# Altium integrated library Plytka_rozwojowa_ZCAD.IntLib: 103 symbols (part 1 of 2)
Pins are listed as number, name and electrical type; pins without a type are passive.

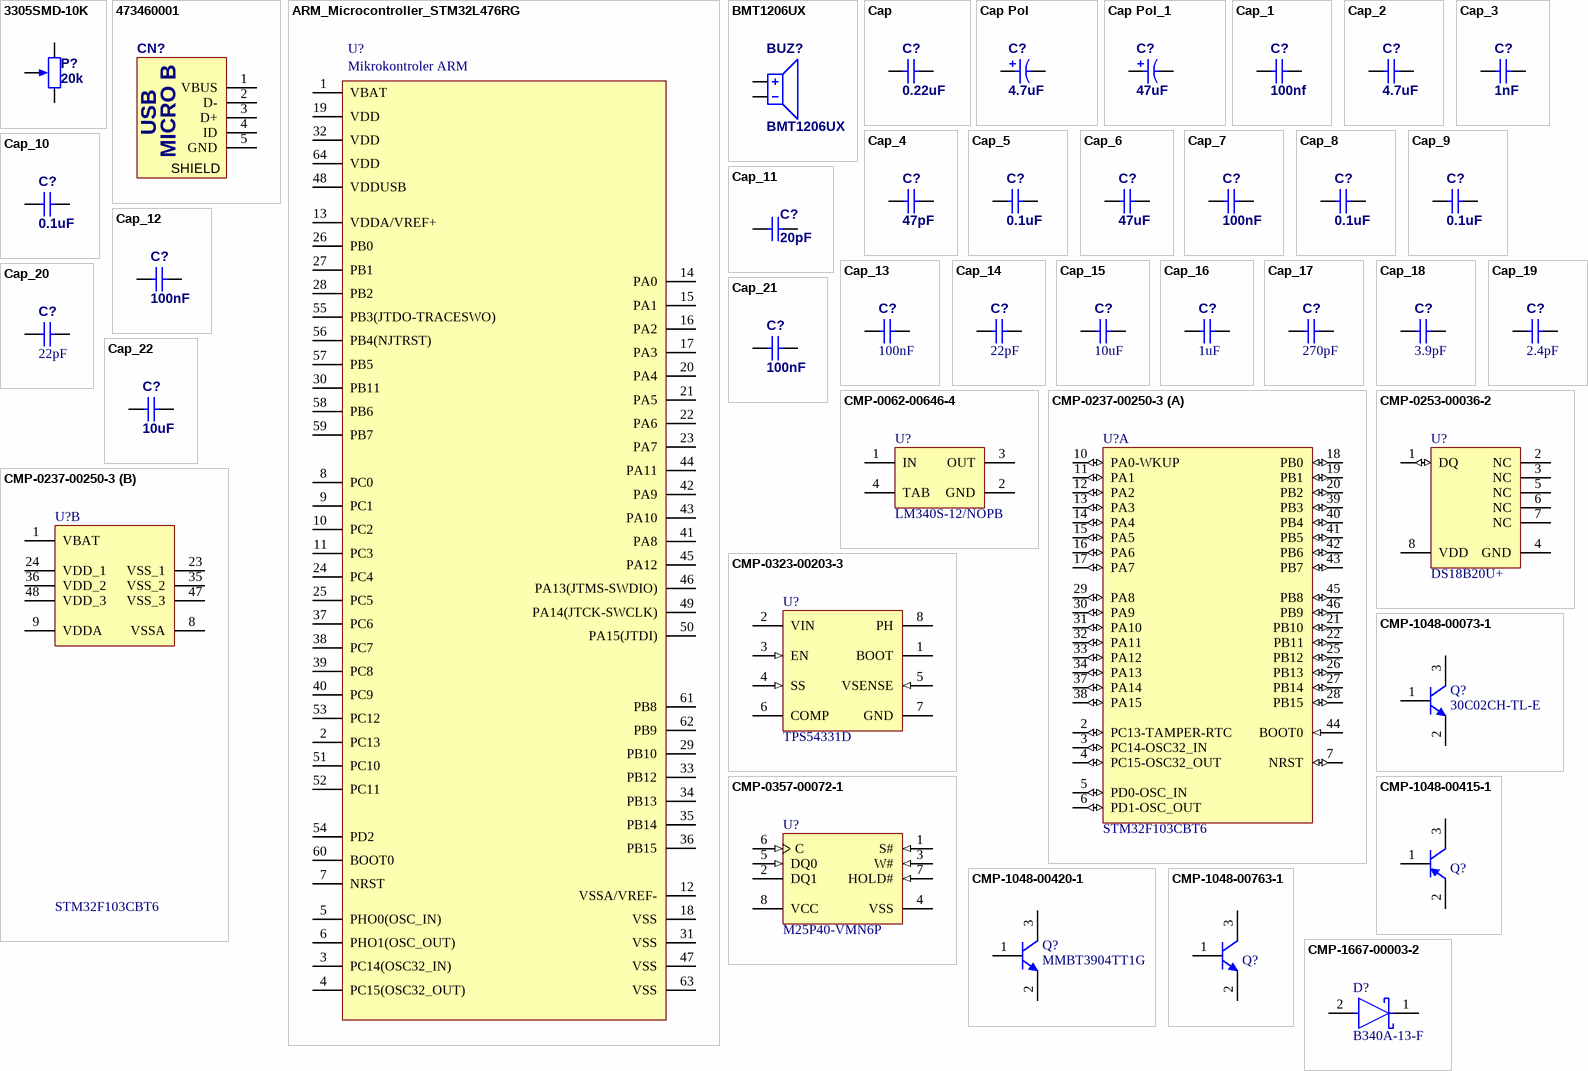
[diagram p0: symbols 3305SMD-10K to CMP-1667-00003-2]

## 3305SMD-10K
designator P?, comment 20k
3305SMD-10K; Published: 21-10-2009; ComponentLink1Description: datasheet; ComponentLink2Description: supplier; Value: 20k
footprint 3305SMD (SRPassives 3305 SMT trimming potentiometer)
pins: 1 TOP, 2 BOT, 3 TAP
1 alternate drawing of the same symbol

## 473460001
designator CN?  (value not drawn)
Molex 473460001 microUSB Connector; Published: 20-Mar-2006; Supplier 1: Farnell; Supplier 2: TME; Supplier Part Number 1: 2426321; Supplier Part Number 2: MX-47346-0001; Shop link: TME: @MX-105017-0001
footprint 473460001 (Molex 473460001 microUSB Connector)
pins: 1 VBUS "+5 VDC", 2 D- "Data -", 3 D+ "Data +", 4 ID "Ground", 5 GND "Ground", S SHIELD hidden "Shield"
text: USB; MICRO B

## ARM_Microcontroller_STM32L476RG
designator U?, comment Mikrokontroler ARM
Model: STM32L476RGT6; Shop link: https://pl.mouser.com/ProductDetail/STMicroelectronics/STM32L476RGT6?qs=o58qnh%2FCpu44V%252B7CaDZzCA%3D%3D; Quantity: *; Voltage: *; Assembly type: SMD; Footprint link: https://www.snapeda.com/parts/STM32L476RGT6/STMicroelectronics/view-part/?ref=search&t=STM32L476RGT6; Value: *; 3D model link: https://www.st.com/en/microcontrollers-microprocessors/stm32l476rg.html#cad-resources
footprint QFP50P1200X1200X160-64N
pins: 1 VBAT, 2 PC13, 3 PC14(OSC32_IN), 4 PC15(OSC32_OUT), 5 PHO0(OSC_IN), 6 PHO1(OSC_OUT), 7 NRST, 8 PC0, 9 PC1, 10 PC2, 11 PC3, 12 VSSA/VREF-, 13 VDDA/VREF+, 14 PA0, 15 PA1, 16 PA2, 17 PA3, 18 VSS, 19 VDD, 20 PA4, 21 PA5, 22 PA6, 23 PA7, 24 PC4, 25 PC5, 26 PB0, 27 PB1, 28 PB2, 29 PB10, 30 PB11, 31 VSS, 32 VDD, 33 PB12, 34 PB13, 35 PB14, 36 PB15, 37 PC6, 38 PC7, 39 PC8, 40 PC9, 41 PA8, 42 PA9, 43 PA10, 44 PA11, 45 PA12, 46 PA13(JTMS-SWDIO), 47 VSS, 48 VDDUSB, 49 PA14(JTCK-SWCLK), 50 PA15(JTDI), 51 PC10, 52 PC11, 53 PC12, 54 PD2, 55 PB3(JTDO-TRACESWO), 56 PB4(NJTRST), 57 PB5, 58 PB6, 59 PB7, 60 BOOT0, 61 PB8, 62 PB9, 63 VSS, 64 VDD

## BMT1206UX
designator BUZ?
Buzzer
footprint BUZ-12-7,6 (BUZZER (w generator), D:12mm, P:7,6mm (eg. BMT1203UX))
footprint BUZ-12-7,6-COVER (BUZZER (w generator), D:12mm, P:7,6mm (eg. BMT1203UX))
footprint Buzzer - LD-BZEG-1305 (https://www.tme.eu/pl/details/bmt-0912xh05/sygnalizatory-elektromag-z-generatorem/bestar/bmt0912xh05/)
pins: 1, 2

## Cap
designator C?  value 0.22uF
Ceramic capacitor MLCC SMD ±5%; ComponentLink1Description: datasheet; ComponentLink2Description: supplier
footprint C0805
footprint C1206
footprint CC2,5
footprint CC5
footprint CC7,5
footprint CC5-10-15
footprint C0603
footprint C0402
footprint CF5X10,5X10,3-7,5 (Polyester capacitor, 5(W)x10,5(H)x10,3(L); WIMA MKS4)
footprint CF2,5X7X10-7,5 (Polyester capacitor, 2,5(W)x7(H)x10(L); WIMA MKS4)
simulation model CAP (Default semiconductor capacitor)
footprint C1206_OLD
footprint C1210 (Chip Capacitor, Body 3.2x2.5mm, IPC High Density)
footprint 0805
pins: 1, 2
2 alternate drawings of the same symbol

## Cap Pol
designator C?  value 4.7uF
Polarized Capacitor SMD low ESR ±1%; ComponentLink1Description: datasheet; ComponentLink2Description: supplier
footprint CE6,3x11-2,5 (Aluminium Electrolytic Capacitor -  Radius: 6,3mm, Height: 11mm, PinSpacing: 2,5mm)
footprint CE8x11,5-3,5 (Aluminium Electrolytic Capacitor -  Radius: 8mm, Height: 11,5mm, PinSpacing: 3,5mm)
footprint CE10x16-5 (Aluminium Electrolytic Capacitor -  Radius: 10mm, Height: 16mm, PinSpacing: 5mm)
footprint CE22-10 (Aluminium Electrolytic Capacitor -  Radius: 22mm, Height: xx mm, PinSpacing: 10mm)
footprint CE4x7-1,5 (Aluminium Electrolytic Capacitor -  Radius: 4mm, Height: 7mm, PinSpacing: 2mm)
footprint CE5x7-2 (Aluminium Electrolytic Capacitor -  Radius: 5mm, Height: 7mm, PinSpacing: 2mm)
footprint CE5x7-2_RA (Aluminium Electrolytic Capacitor -  Radius: 5mm, Height: 7mm, PinSpacing: 2mm, Right Angle)
footprint CE5x11-2 (Aluminium Electrolytic Capacitor -  Radius: 5mm, Height: 11mm, PinSpacing: 2mm)
footprint CE5x11-2_RA (Aluminium Electrolytic Capacitor -  Radius: 5mm, Height: 11mm, PinSpacing: 2mm, Right Angle)
footprint CE6,3x7-2,5 (Aluminium Electrolytic Capacitor -  Radius: 6,3mm, Height: 7mm, PinSpacing: 2,5mm)
footprint CE6,3x7-2,5_RA (Aluminium Electrolytic Capacitor -  Radius: 6,3mm, Height: 7mm, PinSpacing: 2,5mm, Right Angle)
footprint CE6,3x11-2 (Aluminium Electrolytic Capacitor -  Radius: 6,3mm, Height: 11mm, PinSpacing: 2,5mm)
footprint CE6,3x11-2_RA (Aluminium Electrolytic Capacitor -  Radius: 6,3mm, Height: 11mm, PinSpacing: 2mm, Right Angle)
footprint CE6,3x11-2,5_RA (Aluminium Electrolytic Capacitor -  Radius: 6,3mm, Height: 11mm, PinSpacing: 2,5mm, Right Angle)
footprint CE6,3x12,5-2,5 (Aluminium Electrolytic Capacitor -  Radius: 6,3mm, Height: 11mm, PinSpacing: 2,5mm)
footprint CE6,3x12,5-2,5_RA (Aluminium Electrolytic Capacitor -  Radius: 6,3mm, Height: 12,5mm, PinSpacing: 2,5mm, Right Angle)
footprint CE8x11,5-3,5_RA (Aluminium Electrolytic Capacitor -  Radius: 8mm, Height: 11,5mm, PinSpacing: 3,5mm, Right Angle)
footprint CE10x12,5-5 (Aluminium Electrolytic Capacitor -  Radius: 10mm, Height: 12,5mm, PinSpacing: 5mm)
footprint CE10x12,5-5_RA (Aluminium Electrolytic Capacitor -  Radius: 10mm, Height: 12,5mm, PinSpacing: 5mm, Right Angle)
footprint CE10x16-5_RA (Aluminium Electrolytic Capacitor -  Radius: 10mm, Height: 16mm, PinSpacing: 5mm, Right Angle)
footprint CE10x20-5 (Aluminium Electrolytic Capacitor -  Radius: 10mm, Height: 20mm, PinSpacing: 5mm)
footprint CE10x20-5_RA (Aluminium Electrolytic Capacitor -  Radius: 10mm, Height: 20mm, PinSpacing: 5mm, Right Angle)
footprint CES_A_3.3x3.3_5.4 (Electrolit Capacitor A Size; base: 3.3x3.3mm, height: 5.4mm)
footprint CES_B_4.3x4.3_5.4 (SMT Aluminum Electrolytic Capacitor, B Size; base: 4.3x4.3mm, height: 5.4mm)
footprint CES_C_5.3x5.3_5.4 (SMT Aluminum Electrolytic Capacitor, C Size; base: 5.3x5.3mm, height: 5.4mm)
footprint CES_D_6.6x6.6_5.4 (SMT Aluminum Electrolytic Capacitor, D Size; base: 6.6x6.6mm, height: 5.4mm)
footprint CES_D8_6.6x6.6_7.7 (SMT Aluminum Electrolytic Capacitor, D8 Size; base: 6.6x6.6mm, height: 7.7mm)
footprint CES_E_8.3x8.3_6.2 (SMT Aluminum Electrolytic Capacitor, E Size; base: 8.3x8.3mm, height: 6.2mm)
footprint CES_F_8.3x8.3_10.2 (SMT Aluminum Electrolytic Capacitor, F Size; base: 8.3x8.3mm, height: 10.2mm)
footprint CES_G_10.3x10.3_10.2 (SMT Aluminum Electrolytic Capacitor, G Size; base: 10.3x10.3mm, height: 10.2mm)
simulation model CAP (Default semiconductor capacitor)
pins: 1, 2
2 alternate drawings of the same symbol

## Cap Pol_1
designator C?  value 47uF
Polarized Capacitor SMD low ESR ±1%; ComponentLink1Description: datasheet; ComponentLink2Description: supplier
footprint CE6,3x11-2,5 (Aluminium Electrolytic Capacitor -  Radius: 6,3mm, Height: 11mm, PinSpacing: 2,5mm)
footprint CE8x11,5-3,5 (Aluminium Electrolytic Capacitor -  Radius: 8mm, Height: 11,5mm, PinSpacing: 3,5mm)
footprint CE10x16-5 (Aluminium Electrolytic Capacitor -  Radius: 10mm, Height: 16mm, PinSpacing: 5mm)
footprint CE22-10 (Aluminium Electrolytic Capacitor -  Radius: 22mm, Height: xx mm, PinSpacing: 10mm)
footprint CE4x7-1,5 (Aluminium Electrolytic Capacitor -  Radius: 4mm, Height: 7mm, PinSpacing: 2mm)
footprint CE5x7-2 (Aluminium Electrolytic Capacitor -  Radius: 5mm, Height: 7mm, PinSpacing: 2mm)
footprint CE5x7-2_RA (Aluminium Electrolytic Capacitor -  Radius: 5mm, Height: 7mm, PinSpacing: 2mm, Right Angle)
footprint CE5x11-2 (Aluminium Electrolytic Capacitor -  Radius: 5mm, Height: 11mm, PinSpacing: 2mm)
footprint CE5x11-2_RA (Aluminium Electrolytic Capacitor -  Radius: 5mm, Height: 11mm, PinSpacing: 2mm, Right Angle)
footprint CE6,3x7-2,5 (Aluminium Electrolytic Capacitor -  Radius: 6,3mm, Height: 7mm, PinSpacing: 2,5mm)
footprint CE6,3x7-2,5_RA (Aluminium Electrolytic Capacitor -  Radius: 6,3mm, Height: 7mm, PinSpacing: 2,5mm, Right Angle)
footprint CE6,3x11-2 (Aluminium Electrolytic Capacitor -  Radius: 6,3mm, Height: 11mm, PinSpacing: 2,5mm)
footprint CE6,3x11-2_RA (Aluminium Electrolytic Capacitor -  Radius: 6,3mm, Height: 11mm, PinSpacing: 2mm, Right Angle)
footprint CE6,3x11-2,5_RA (Aluminium Electrolytic Capacitor -  Radius: 6,3mm, Height: 11mm, PinSpacing: 2,5mm, Right Angle)
footprint CE6,3x12,5-2,5 (Aluminium Electrolytic Capacitor -  Radius: 6,3mm, Height: 11mm, PinSpacing: 2,5mm)
footprint CE6,3x12,5-2,5_RA (Aluminium Electrolytic Capacitor -  Radius: 6,3mm, Height: 12,5mm, PinSpacing: 2,5mm, Right Angle)
footprint CE8x11,5-3,5_RA (Aluminium Electrolytic Capacitor -  Radius: 8mm, Height: 11,5mm, PinSpacing: 3,5mm, Right Angle)
footprint CE10x12,5-5 (Aluminium Electrolytic Capacitor -  Radius: 10mm, Height: 12,5mm, PinSpacing: 5mm)
footprint CE10x12,5-5_RA (Aluminium Electrolytic Capacitor -  Radius: 10mm, Height: 12,5mm, PinSpacing: 5mm, Right Angle)
footprint CE10x16-5_RA (Aluminium Electrolytic Capacitor -  Radius: 10mm, Height: 16mm, PinSpacing: 5mm, Right Angle)
footprint CE10x20-5 (Aluminium Electrolytic Capacitor -  Radius: 10mm, Height: 20mm, PinSpacing: 5mm)
footprint CE10x20-5_RA (Aluminium Electrolytic Capacitor -  Radius: 10mm, Height: 20mm, PinSpacing: 5mm, Right Angle)
footprint CES_A_3.3x3.3_5.4 (Electrolit Capacitor A Size; base: 3.3x3.3mm, height: 5.4mm)
footprint CES_B_4.3x4.3_5.4 (SMT Aluminum Electrolytic Capacitor, B Size; base: 4.3x4.3mm, height: 5.4mm)
footprint CES_C_5.3x5.3_5.4 (SMT Aluminum Electrolytic Capacitor, C Size; base: 5.3x5.3mm, height: 5.4mm)
footprint CES_D_6.6x6.6_5.4 (SMT Aluminum Electrolytic Capacitor, D Size; base: 6.6x6.6mm, height: 5.4mm)
footprint CES_D8_6.6x6.6_7.7 (SMT Aluminum Electrolytic Capacitor, D8 Size; base: 6.6x6.6mm, height: 7.7mm)
footprint CES_E_8.3x8.3_6.2 (SMT Aluminum Electrolytic Capacitor, E Size; base: 8.3x8.3mm, height: 6.2mm)
footprint CES_F_8.3x8.3_10.2 (SMT Aluminum Electrolytic Capacitor, F Size; base: 8.3x8.3mm, height: 10.2mm)
footprint CES_G_10.3x10.3_10.2 (SMT Aluminum Electrolytic Capacitor, G Size; base: 10.3x10.3mm, height: 10.2mm)
simulation model CAP (Default semiconductor capacitor)
pins: 1, 2
2 alternate drawings of the same symbol

## Cap_1
designator C?  value 100nf
Ceramic capacitor MLCC SMD ±5%; Voltage: 100VDC; ComponentLink1Description: datasheet; ComponentLink2Description: supplier
footprint C0805
footprint C1206
footprint CC2,5
footprint CC5
footprint CC7,5
footprint CC5-10-15
footprint C0603
footprint C0402
footprint CF5X10,5X10,3-7,5 (Polyester capacitor, 5(W)x10,5(H)x10,3(L); WIMA MKS4)
footprint CF2,5X7X10-7,5 (Polyester capacitor, 2,5(W)x7(H)x10(L); WIMA MKS4)
simulation model CAP (Default semiconductor capacitor)
footprint C1206_OLD
footprint C1210 (Chip Capacitor, Body 3.2x2.5mm, IPC High Density)
pins: 1, 2
2 alternate drawings of the same symbol

## Cap_2
designator C?  value 4.7uF
Ceramic capacitor MLCC SMD ±5%; ComponentLink1Description: datasheet; ComponentLink2Description: supplier
footprint C0805
footprint C1206
footprint CC2,5
footprint CC5
footprint CC7,5
footprint CC5-10-15
footprint C0603
footprint C0402
footprint CF5X10,5X10,3-7,5 (Polyester capacitor, 5(W)x10,5(H)x10,3(L); WIMA MKS4)
footprint CF2,5X7X10-7,5 (Polyester capacitor, 2,5(W)x7(H)x10(L); WIMA MKS4)
simulation model CAP (Default semiconductor capacitor)
footprint C1206_OLD
footprint C1210 (Chip Capacitor, Body 3.2x2.5mm, IPC High Density)
pins: 1, 2
2 alternate drawings of the same symbol

## Cap_3
designator C?  value 1nF
Ceramic capacitor MLCC SMD ±5%; ComponentLink1Description: datasheet; ComponentLink2Description: supplier
footprint C0805
footprint C1206
footprint CC2,5
footprint CC5
footprint CC7,5
footprint CC5-10-15
footprint C0603
footprint C0402
footprint CF5X10,5X10,3-7,5 (Polyester capacitor, 5(W)x10,5(H)x10,3(L); WIMA MKS4)
footprint CF2,5X7X10-7,5 (Polyester capacitor, 2,5(W)x7(H)x10(L); WIMA MKS4)
simulation model CAP (Default semiconductor capacitor)
footprint C1206_OLD
footprint C1210 (Chip Capacitor, Body 3.2x2.5mm, IPC High Density)
pins: 1, 2
2 alternate drawings of the same symbol

## Cap_4
designator C?  value 47pF
Ceramic capacitor MLCC SMD ±5%; ComponentLink1Description: datasheet; ComponentLink2Description: supplier
footprint C0805
footprint C1206
footprint CC2,5
footprint CC5
footprint CC7,5
footprint CC5-10-15
footprint C0603
footprint C0402
footprint CF5X10,5X10,3-7,5 (Polyester capacitor, 5(W)x10,5(H)x10,3(L); WIMA MKS4)
footprint CF2,5X7X10-7,5 (Polyester capacitor, 2,5(W)x7(H)x10(L); WIMA MKS4)
simulation model CAP (Default semiconductor capacitor)
footprint C1206_OLD
footprint C1210 (Chip Capacitor, Body 3.2x2.5mm, IPC High Density)
pins: 1, 2
2 alternate drawings of the same symbol

## Cap_5
designator C?  value 0.1uF
Ceramic capacitor MLCC SMD ±5%; ComponentLink1Description: datasheet; ComponentLink2Description: supplier
footprint C0805
footprint C1206
footprint CC2,5
footprint CC5
footprint CC7,5
footprint CC5-10-15
footprint C0603
footprint C0402
footprint CF5X10,5X10,3-7,5 (Polyester capacitor, 5(W)x10,5(H)x10,3(L); WIMA MKS4)
footprint CF2,5X7X10-7,5 (Polyester capacitor, 2,5(W)x7(H)x10(L); WIMA MKS4)
simulation model CAP (Default semiconductor capacitor)
footprint C1206_OLD
footprint C1210 (Chip Capacitor, Body 3.2x2.5mm, IPC High Density)
pins: 1, 2
2 alternate drawings of the same symbol

## Cap_6
designator C?  value 47uF
Ceramic capacitor MLCC SMD ±5%; ComponentLink1Description: datasheet; ComponentLink2Description: supplier
footprint C0805
footprint C1206
footprint CC2,5
footprint CC5
footprint CC7,5
footprint CC5-10-15
footprint C0603
footprint C0402
footprint CF5X10,5X10,3-7,5 (Polyester capacitor, 5(W)x10,5(H)x10,3(L); WIMA MKS4)
footprint CF2,5X7X10-7,5 (Polyester capacitor, 2,5(W)x7(H)x10(L); WIMA MKS4)
simulation model CAP (Default semiconductor capacitor)
footprint C1206_OLD
footprint C1210 (Chip Capacitor, Body 3.2x2.5mm, IPC High Density)
pins: 1, 2
2 alternate drawings of the same symbol

## Cap_7
designator C?  value 100nF
Ceramic capacitor MLCC SMD ±1%; Voltage: 100VDC; ComponentLink1Description: datasheet; ComponentLink2Description: supplier
footprint C0805
footprint C1206
footprint CC2,5
footprint CC5
footprint CC7,5
footprint CC5-10-15
footprint C0603
footprint C0402
footprint CF5X10,5X10,3-7,5 (Polyester capacitor, 5(W)x10,5(H)x10,3(L); WIMA MKS4)
footprint CF2,5X7X10-7,5 (Polyester capacitor, 2,5(W)x7(H)x10(L); WIMA MKS4)
simulation model CAP (Default semiconductor capacitor)
footprint C1206_OLD
footprint C1210 (Chip Capacitor, Body 3.2x2.5mm, IPC High Density)
pins: 1, 2
2 alternate drawings of the same symbol

## Cap_8
designator C?, comment value 0.1uF  (hidden comment: 1uF)
Ceramic capacitor MLCC SMD ±5%; ComponentLink1Description: datasheet; ComponentLink2Description: supplier
footprint C0805
footprint C1206
footprint CC2,5
footprint CC5
footprint CC7,5
footprint CC5-10-15
footprint C0603
footprint C0402
footprint CF5X10,5X10,3-7,5 (Polyester capacitor, 5(W)x10,5(H)x10,3(L); WIMA MKS4)
footprint CF2,5X7X10-7,5 (Polyester capacitor, 2,5(W)x7(H)x10(L); WIMA MKS4)
simulation model CAP (Default semiconductor capacitor)
footprint C1206_OLD
footprint C1210 (Chip Capacitor, Body 3.2x2.5mm, IPC High Density)
pins: 1, 2
2 alternate drawings of the same symbol

## Cap_9
designator C?, comment value 0.1uF  (hidden comment: 100n)
Ceramic capacitor MLCC SMD ±5%; ComponentLink1Description: datasheet; ComponentLink2Description: supplier
footprint C0805
footprint C1206
footprint CC2,5
footprint CC5
footprint CC7,5
footprint CC5-10-15
footprint C0603
footprint C0402
footprint CF5X10,5X10,3-7,5 (Polyester capacitor, 5(W)x10,5(H)x10,3(L); WIMA MKS4)
footprint CF2,5X7X10-7,5 (Polyester capacitor, 2,5(W)x7(H)x10(L); WIMA MKS4)
simulation model CAP (Default semiconductor capacitor)
footprint C1206_OLD
footprint C1210 (Chip Capacitor, Body 3.2x2.5mm, IPC High Density)
pins: 1, 2
2 alternate drawings of the same symbol

## Cap_10
designator C?, comment value 0.1uF  (hidden comment: 10uF)
Ceramic capacitor MLCC SMD ±5%; ComponentLink1Description: datasheet; ComponentLink2Description: supplier
footprint C0805
footprint C1206
footprint CC2,5
footprint CC5
footprint CC7,5
footprint CC5-10-15
footprint C0603
footprint C0402
footprint CF5X10,5X10,3-7,5 (Polyester capacitor, 5(W)x10,5(H)x10,3(L); WIMA MKS4)
footprint CF2,5X7X10-7,5 (Polyester capacitor, 2,5(W)x7(H)x10(L); WIMA MKS4)
simulation model CAP (Default semiconductor capacitor)
footprint C1206_OLD
footprint C1210 (Chip Capacitor, Body 3.2x2.5mm, IPC High Density)
pins: 1, 2
2 alternate drawings of the same symbol

## Cap_11
designator C?, comment 20pF
Ceramic capacitor MLCC SMD ±1%; ComponentLink1Description: datasheet; ComponentLink2Description: supplier; Value: 20pF
footprint C0805
footprint C1206
footprint CC2,5
footprint CC5
footprint CC7,5
footprint CC5-10-15
footprint C0603
footprint C0402
footprint CF5X10,5X10,3-7,5 (Polyester capacitor, 5(W)x10,5(H)x10,3(L); WIMA MKS4)
footprint CF2,5X7X10-7,5 (Polyester capacitor, 2,5(W)x7(H)x10(L); WIMA MKS4)
simulation model CAP (Default semiconductor capacitor)
footprint C1206_OLD
footprint C1210 (Chip Capacitor, Body 3.2x2.5mm, IPC High Density)
pins: 1, 2
2 alternate drawings of the same symbol

## Cap_12
designator C?, comment 100nF
Ceramic capacitor MLCC SMD ±5%; ComponentLink1Description: datasheet; ComponentLink2Description: supplier; Value: 100nF
footprint C0805
footprint C1206
footprint CC2,5
footprint CC5
footprint CC7,5
footprint CC5-10-15
footprint C0603
footprint C0402
footprint CF5X10,5X10,3-7,5 (Polyester capacitor, 5(W)x10,5(H)x10,3(L); WIMA MKS4)
footprint CF2,5X7X10-7,5 (Polyester capacitor, 2,5(W)x7(H)x10(L); WIMA MKS4)
simulation model CAP (Default semiconductor capacitor)
footprint C1206_OLD
footprint C1210 (Chip Capacitor, Body 3.2x2.5mm, IPC High Density)
pins: 1, 2
2 alternate drawings of the same symbol

## Cap_13
designator C?, comment 100nF
Ceramic capacitor MLCC SMD ±1%; ComponentLink1Description: datasheet; ComponentLink2Description: supplier; Value: 100nF
footprint C0805
footprint C1206
footprint CC2,5
footprint CC5
footprint CC7,5
footprint CC5-10-15
footprint C0603
footprint C0402
footprint CF5X10,5X10,3-7,5 (Polyester capacitor, 5(W)x10,5(H)x10,3(L); WIMA MKS4)
footprint CF2,5X7X10-7,5 (Polyester capacitor, 2,5(W)x7(H)x10(L); WIMA MKS4)
simulation model CAP (Default semiconductor capacitor)
footprint C1206_OLD
footprint C1210 (Chip Capacitor, Body 3.2x2.5mm, IPC High Density)
pins: 1, 2
2 alternate drawings of the same symbol

## Cap_14
designator C?, comment 22pF
Ceramic capacitor MLCC SMD ±1%; ComponentLink1Description: datasheet; ComponentLink2Description: supplier; Value: 22pF
footprint C0805
footprint C1206
footprint CC2,5
footprint CC5
footprint CC7,5
footprint CC5-10-15
footprint C0603
footprint C0402
footprint CF5X10,5X10,3-7,5 (Polyester capacitor, 5(W)x10,5(H)x10,3(L); WIMA MKS4)
footprint CF2,5X7X10-7,5 (Polyester capacitor, 2,5(W)x7(H)x10(L); WIMA MKS4)
simulation model CAP (Default semiconductor capacitor)
footprint C1206_OLD
footprint C1210 (Chip Capacitor, Body 3.2x2.5mm, IPC High Density)
pins: 1, 2
2 alternate drawings of the same symbol

## Cap_15
designator C?, comment 10uF
Ceramic capacitor MLCC SMD ±1%; Value: 100nF; ComponentLink1Description: datasheet; ComponentLink2Description: supplier
footprint C0805
footprint C1206
footprint CC2,5
footprint CC5
footprint CC7,5
footprint CC5-10-15
footprint C0603
footprint C0402
footprint CF5X10,5X10,3-7,5 (Polyester capacitor, 5(W)x10,5(H)x10,3(L); WIMA MKS4)
footprint CF2,5X7X10-7,5 (Polyester capacitor, 2,5(W)x7(H)x10(L); WIMA MKS4)
simulation model CAP (Default semiconductor capacitor)
footprint C1206_OLD
footprint C1210 (Chip Capacitor, Body 3.2x2.5mm, IPC High Density)
pins: 1, 2
2 alternate drawings of the same symbol

## Cap_16
designator C?, comment 1uF
Ceramic capacitor MLCC SMD ±1%; Value: 100nF; ComponentLink1Description: datasheet; ComponentLink2Description: supplier
footprint C0805
footprint C1206
footprint CC2,5
footprint CC5
footprint CC7,5
footprint CC5-10-15
footprint C0603
footprint C0402
footprint CF5X10,5X10,3-7,5 (Polyester capacitor, 5(W)x10,5(H)x10,3(L); WIMA MKS4)
footprint CF2,5X7X10-7,5 (Polyester capacitor, 2,5(W)x7(H)x10(L); WIMA MKS4)
simulation model CAP (Default semiconductor capacitor)
footprint C1206_OLD
footprint C1210 (Chip Capacitor, Body 3.2x2.5mm, IPC High Density)
pins: 1, 2
2 alternate drawings of the same symbol

## Cap_17
designator C?, comment 270pF
Ceramic capacitor MLCC SMD ±1%; Value: 100nF; ComponentLink1Description: datasheet; ComponentLink2Description: supplier
footprint C0805
footprint C1206
footprint CC2,5
footprint CC5
footprint CC7,5
footprint CC5-10-15
footprint C0603
footprint C0402
footprint CF5X10,5X10,3-7,5 (Polyester capacitor, 5(W)x10,5(H)x10,3(L); WIMA MKS4)
footprint CF2,5X7X10-7,5 (Polyester capacitor, 2,5(W)x7(H)x10(L); WIMA MKS4)
simulation model CAP (Default semiconductor capacitor)
footprint C1206_OLD
footprint C1210 (Chip Capacitor, Body 3.2x2.5mm, IPC High Density)
pins: 1, 2
2 alternate drawings of the same symbol

## Cap_18
designator C?, comment 3.9pF
Ceramic capacitor MLCC SMD ±1%; Value: 100nF; ComponentLink1Description: datasheet; ComponentLink2Description: supplier
footprint C0805
footprint C1206
footprint CC2,5
footprint CC5
footprint CC7,5
footprint CC5-10-15
footprint C0603
footprint C0402
footprint CF5X10,5X10,3-7,5 (Polyester capacitor, 5(W)x10,5(H)x10,3(L); WIMA MKS4)
footprint CF2,5X7X10-7,5 (Polyester capacitor, 2,5(W)x7(H)x10(L); WIMA MKS4)
simulation model CAP (Default semiconductor capacitor)
footprint C1206_OLD
footprint C1210 (Chip Capacitor, Body 3.2x2.5mm, IPC High Density)
pins: 1, 2
2 alternate drawings of the same symbol

## Cap_19
designator C?, comment 2.4pF
Ceramic capacitor MLCC SMD ±1%; Value: 100nF; ComponentLink1Description: datasheet; ComponentLink2Description: supplier
footprint C0805
footprint C1206
footprint CC2,5
footprint CC5
footprint CC7,5
footprint CC5-10-15
footprint C0603
footprint C0402
footprint CF5X10,5X10,3-7,5 (Polyester capacitor, 5(W)x10,5(H)x10,3(L); WIMA MKS4)
footprint CF2,5X7X10-7,5 (Polyester capacitor, 2,5(W)x7(H)x10(L); WIMA MKS4)
simulation model CAP (Default semiconductor capacitor)
footprint C1206_OLD
footprint C1210 (Chip Capacitor, Body 3.2x2.5mm, IPC High Density)
pins: 1, 2
2 alternate drawings of the same symbol

## Cap_20
designator C?, comment 22pF
Ceramic capacitor MLCC SMD ±1%; Value: 100nF; ComponentLink1Description: datasheet; ComponentLink2Description: supplier
footprint C0805
footprint C1206
footprint CC2,5
footprint CC5
footprint CC7,5
footprint CC5-10-15
footprint C0603
footprint C0402
footprint CF5X10,5X10,3-7,5 (Polyester capacitor, 5(W)x10,5(H)x10,3(L); WIMA MKS4)
footprint CF2,5X7X10-7,5 (Polyester capacitor, 2,5(W)x7(H)x10(L); WIMA MKS4)
simulation model CAP (Default semiconductor capacitor)
footprint C1206_OLD
footprint C1210 (Chip Capacitor, Body 3.2x2.5mm, IPC High Density)
pins: 1, 2
2 alternate drawings of the same symbol

## Cap_21
designator C?, comment 100nF
Capacitor; ComponentLink1Description: datasheet; ComponentLink2Description: supplier; Value: 100nF
footprint C0805
footprint C1206
footprint CC2,5
footprint CC5
footprint CC7,5
footprint CC5-10-15
footprint C0603
footprint C0402
footprint CF5X10,5X10,3-7,5 (Polyester capacitor, 5(W)x10,5(H)x10,3(L); WIMA MKS4)
footprint CF2,5X7X10-7,5 (Polyester capacitor, 2,5(W)x7(H)x10(L); WIMA MKS4)
simulation model CAP (Default semiconductor capacitor)
footprint C1206_OLD
footprint C1210 (Chip Capacitor, Body 3.2x2.5mm, IPC High Density)
pins: 1, 2
2 alternate drawings of the same symbol

## Cap_22
designator C?, comment 10uF
Capacitor; ComponentLink1Description: datasheet; ComponentLink2Description: supplier; Value: 10uF
footprint C0805
footprint C1206
footprint CC2,5
footprint CC5
footprint CC7,5
footprint CC5-10-15
footprint C0603
footprint C0402
footprint CF5X10,5X10,3-7,5 (Polyester capacitor, 5(W)x10,5(H)x10,3(L); WIMA MKS4)
footprint CF2,5X7X10-7,5 (Polyester capacitor, 2,5(W)x7(H)x10(L); WIMA MKS4)
simulation model CAP (Default semiconductor capacitor)
footprint C1206_OLD
footprint C1210 (Chip Capacitor, Body 3.2x2.5mm, IPC High Density)
pins: 1, 2
2 alternate drawings of the same symbol

## CMP-0062-00646-4
designator U?, comment LM340S-12/NOPB
Series 3-Terminal Positive Regulators, 3-pin TO-263, Pb-Free; Manufacturer: Texas Instruments; Manufacturer 1: TI National Semiconductor; PackageTopMarking: NSUZXYTTE#*LM340S*-12 P+; CompType: LDO IC; PowerWise: N; Voltage: 35V; Current: 1.5A; RoHS: Y; PackageDescription: TO-263, Molded, .400 x .390 x .180in, 3 Lead, .1in Pitch, Surface Mount; ComponentLink1URL: http://www.ti.com/general/docs/lit/getliterature.tsp?genericPartNumber=LM340&fileType=pdf; PinCount: 3; ComponentLink1Description: Datasheet URL; Code_JEDEC: MO-169-AA; PackageReference: KTT0003B; Footprint: TO-263; Footprint model: https://octopart.com/lm340s-12%2Fnopb-texas+instruments-24813791?r=sp#CadModels; 3D model: https://octopart.com/lm340s-12%2Fnopb-texas+instruments-24813791?r=sp#CadModels; Shop link: Mouser: @926-LM340S-12/NOPB; Manufacturer Part Number 1: LM340S-12/NOPB
footprint KTT0003B_N (D2-PAK, 3-Leads, Body 10.41x8.89mm, Pitch 2.54mm, IPC Medium Density)
footprint KTT0003B_M (D2-PAK, 3-Leads, Body 10.41x8.89mm, Pitch 2.54mm, IPC Low Density)
footprint KTT0003B_L (D2-PAK, 3-Leads, Body 10.41x8.89mm, Pitch 2.54mm, IPC High Density)
pins: 1 IN (power), 2 GND (power), 3 OUT (power), 4 TAB (power)

## CMP-0237-00250-3
designator U?, comment STM32F103CBT6
ARM Cortex-M3 32-bit MCU, 128 KB Flash, 20 KB Internal RAM, 37 I/Os, 48-pin LQFP, -40 to 85 degC, Tray; Manufacturer 1: STMicroelectronics; Supply Voltage(Vcc) min (V): 2; Operating Frequency(F) (Processor speed) (MHz): 72; A/D Converter: 2x12-bit (10 Channel); FLASH Size (Prog) (kB): 128; Internal RAM Size (kB): 20; I/Os (High Current): 37; Voltage: 3.3V; ComponentLink2Description: Datasheet; PackageReference: LQFP48; PartNumber: STM32F103CBT6; ComponentLink1Description: Manufacturer URL; DatasheetVersion: Rev. 16; PackageVersion: Rev. 6, 06/2013; Packing: Tray; ComponentLink1URL: http://www.st.com/web/en/home.html; Mounting Technology: Surface Mount; ComponentLink3URL: http://www.st.com/st-web-ui/static/active/en/resource/technical/document/datasheet/DM00058181.pdf; PackageDescription: 48-Pin Low Profile Quad Flat Package, 7 x 7 mm Body, 0.5 mm Pitch; Core: ARM Cortex-M3; ComponentLink3Description: Package Specification; ComponentLink2URL: http://www.st.com/st-web-ui/static/active/en/resource/technical/document/datasheet/CD00161566.pdf; Footprint: LQFP; Footprint model: https://octopart.com/stm32f103cbt6-stmicroelectronics-7868657?r=sp#Specs; 3D model: https://octopart.com/stm32f103cbt6-stmicroelectronics-7868657?r=sp#Specs; Shop link: Digi-Key: @497-6288-ND; Manufacturer Part Number 1: STM32F103CBT6
footprint STM-LQFP48_L (QFP, 48-Leads, Body 7x7mm, Pitch 0.5mm, IPC High Density)
footprint STM-LQFP48_N (QFP, 48-Leads, Body 7x7mm, Pitch 0.5mm, IPC Medium Density)
footprint STM-LQFP48_M (QFP, 48-Leads, Body 7x7mm, Pitch 0.5mm, IPC Low Density)
part A pins: 2 PC13-TAMPER-RTC (io) "PC13-TAMPER-RTC/PC13/TAMPER-RTC", 3 PC14-OSC32_IN (io) "PC14-OSC32_IN/PC14/OSC32_IN", 4 PC15-OSC32_OUT (io) "PC15-OSC32_OUT/PC15/OSC32_OUT", 5 PD0-OSC_IN (io) "PD0/OSC_IN", 6 PD1-OSC_OUT (io) "PD1/OSC_OUT", 7 NRST (io), 10 PA0-WKUP (io) "PA0-WKUP/PA0/WKUP/USART2_CTS/ADC12_IN0/TIM2_CH1_ETR", 11 PA1 (io) "PA1/USART2_RTS/ADC12_IN1/TIM2_CH2", 12 PA2 (io) "PA2/USART2_TX/ADC12_IN2/TIM2_CH3", 13 PA3 (io) "PA3/USART2_RX/ADC12_IN3/TIM2_CH4", 14 PA4 (io) "PA4/SPI1_NSS/USART2_CK/ADC12_IN4", 15 PA5 (io) "PA5/SPI1_SCK/ADC12_IN5", 16 PA6 (io) "PA6/SPI1_MISO/ADC12_IN6/TIM3_CH1/TIM1_BKIN", 17 PA7 (io) "PA7/SPI1_MOSI/ADC12_IN7/TIM3_CH2/TIM1_CH1N", 18 PB0 (io) "PB0/ADC12_IN8/TIM3_CH3/TIM1_CH2N", 19 PB1 (io) "PB1/ADC12_IN9/TIM3_CH4/TIM1_CH3N", 20 PB2 (io) "PB2/BOOT1", 21 PB10 (io) "PB10/I2C2_SCL/USART3_TX/TIM2_CH3", 22 PB11 (io) "PB11/I2C2_SDA/USART3_RX/TIM2_CH4", 25 PB12 (io) "PB12/SPI2_NSS/I2C2_SMBAl/USART3_CK/TIM1_BKIN", 26 PB13 (io) "PB13/SPI2_SCK/USART3_CTS/TIM1_CH1N", 27 PB14 (io) "PB14/SPI2_MISO/USART3_RTS/TIM1_CH2N", 28 PB15 (io) "PB15/SPI2_MOSI/TIM1_CH3N", 29 PA8 (io) "PA8/USART1_CK/TIM1_CH1/MCO", 30 PA9 (io) "PA9/USART1_TX/TIM1_CH2", 31 PA10 (io) "PA10/USART1_RX/TIM1_CH3", 32 PA11 (io) "PA11/USART1_CTS/CANRX/USBDM/TIM1_CH4", 33 PA12 (io) "PA12/USART1_RTS/CANTX/USBDP/TIM1_ETR", 34 PA13 (io) "PA13/JTMS/SWDIO", 37 PA14 (io) "PA14/JTCK/SWCLK", 38 PA15 (io) "PA15/JTDI/TIM2_CH1_ETR/SPI1_NSS", 39 PB3 (io) "PB3/JTDO/TIM2_CH2/TRACESWO/SPI1_SCK", 40 PB4 (io) "PB4/NJTRST/TIM3_CH1/SPI1_MISO", 41 PB5 (io) "PB5/I2C1_SMBAI/TIM3_CH2/SPI1_MOSI", 42 PB6 (io) "PB6/I2C1_SCL/TIM4_CH1/USART1_TX", 43 PB7 (io) "PB7/I2C1_SDA/TIM4_CH2/USART1_RX", 44 BOOT0 (in), 45 PB8 (io) "PB8/TIM4_CH3/I2C1_SCL/CANRX", 46 PB9 (io) "PB9/TIM4_CH4/I2C1_SDA/CANTX"
part B pins: 1 VBAT (power), 8 VSSA (power), 9 VDDA (power), 23 VSS_1 (power), 24 VDD_1 (power), 35 VSS_2 (power), 36 VDD_2 (power), 47 VSS_3 (power), 48 VDD_3 (power)

## CMP-0253-00036-2
designator U?, comment DS18B20U+
High-Precision 1-Wire Digital Thermometer, -55 to 125 degC, 8-Pin SOP (U8+1), Pb-Free; Manufacturer 1: Maxim; Sensor Type: Local; Multi Droppable: Yes; Temp. Thresh.: Programmable (NV); PackageVersion: Rev. L, 08/2009; Generic Part Number: DS18B20; PackageReference: U8+1; PackageDescription: 8-Pin Micro-MAX, Thin Shrink Small-Outline (U8+1), Body 3 x 3 mm, Pitch 0.65 mm; ComponentLink3URL: http://pdfserv.maximintegrated.com/package_dwgs/21-0036.PDF; Code_JEDEC: MO-187; DatasheetVersion: Rev. 4; ComponentLink1Description: Manufacturer URL; Mounting Technology: Surface Mount; ComponentLink1URL: http://www.maximintegrated.com/; Parasite Pwr.: Yes; RoHS: Pb-Free; ComponentLink2URL: http://datasheets.maximintegrated.com/en/ds/DS18B20.pdf; ComponentLink2Description: Datasheet; Interface: 1-Wire; PartNumber: DS18B20U+; ComponentLink3Description: Package Specification; Manufacturer Part Number 1: DS18B20U+
footprint MAXM-U8+1_L (SOP, 8-Leads, Body 3x3mm, Pitch 0.65mm, IPC High Density)
footprint MAXM-U8+1_N (SOP, 8-Leads, Body 3x3mm, Pitch 0.65mm, IPC Medium Density)
footprint MAXM-U8+1_M (SOP, 8-Leads, Body 3x3mm, Pitch 0.65mm, IPC Low Density)
pins: 1 DQ (io) "Data Input/Output. Open-drain 1-Wire interface pin. Also provides power to the device when used in parasite power mode (see the Powering the DS18B20 section.)", 2 NC "No Connection", 3 NC "No Connection", 4 GND (power) "Ground", 5 NC "No Connection", 6 NC "No Connection", 7 NC "No Connection", 8 VDD (power) "Optional VDD. VDD must be grounded for operation in parasite power mode."